# Altium footprint library 15-LEDs+LCD.PcbLib: 116 footprints (part 8 of 8)
Each footprint in its own frame and in the unit in brackets; x right, y up, seen from the top. Pads: shape width x height; smd on the part's side, far side on the other; paste and mask are expansions set on the pad; w line width, h text height; cw(c..) or ccw(c..) is an arc to the next point about the centre after c.
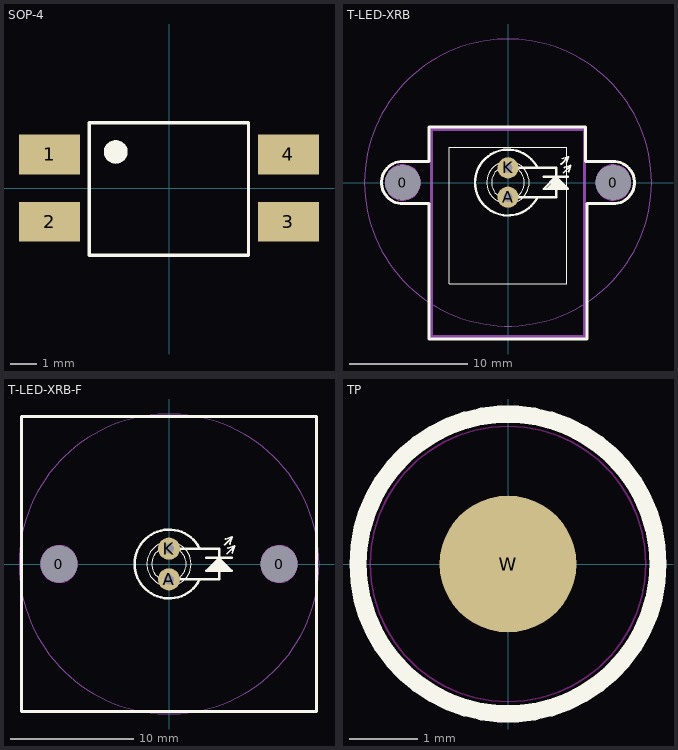
[diagram p7: the footprints below, top view; thin cyan lines are the x and y axes]

## SOP-4 [mm] "PC817"
pads (5):
  rect 2.3x1.5 smd: 1(-4.5,1.27) 2(-4.5,-1.27) 3(4.5,-1.27) 4(4.5,1.27)
  round 0.9 on Top Overlay: ""(-2.005,1.365)
Top Overlay:
  lines w0.127: -3.005,-2.535 -3.005,2.465 2.995,2.465 2.995,-2.535 -3.005,-2.535
3D body "pc817.stp": height 3.7, standoff 0, extent -4.82,-2.29 4.8,2.29

## T-LED-XRB [mm]
height 4.8
pads (4):
  round 1.5 hole 3: 0(-8.95,0) 0(8.95,0)
  round 1.8 hole 0.8: A(0,-1.25) K(0,1.25)
Top Overlay:
  circle w0.001: c0,0 r1.8
  circle w0.001: c0,0 r1.4
  lines w0.01: -5,-8.6 -5,3 5,3 5,-8.6 -5,-8.6
  lines w0.152: 4.517,1.569 5.137,2.189 ; 4.607,2.019 5.137,2.189 ; 4.717,0.839 5.337,1.459 ; 4.807,1.289 5.337,1.459 ; 4.947,1.639 5.137,2.189 ; 5.147,0.909 5.337,1.459
  lines w0.2: 2.484,-1.292 cw(c0,0) 2.484,1.292
  lines w0.203: 0,-1.25 4.09,-1.25 4.09,1.25 0,1.25 ; 3.04,0.5 5.09,0.5 ; 4.04,0.5 5.09,-0.55 3.04,-0.55 4.09,0.5
  lines w0.254: 4.09,0.2 3.39,-0.5 4.79,-0.5 4.19,0.1 3.74,-0.35 4.442,-0.35 4.242,-0.15 ; 8.9,-1.8 6.7,-1.8 6.7,-13.3 -6.731,-13.3 -6.731,-1.8 -8.9,-1.8 cw(c-8.95,0) -8.903,1.799 -6.7,1.799 -6.7,4.7 6.6,4.7 6.6,1.8 9,1.8 ; 8.9,1.799 cw(c8.95,0) 8.903,-1.799
Keep-Out Layer:
  circle w0.025: c-8.95,0 r1.5
  circle w0.025: c8.95,0 r1.5
Mechanical 1:
  circle w0.025: c8.95,0 r1.5
  circle w0.025: c-8.95,0 r1.5
Mechanical 15:
  circle w0.001: c0,0 r12.2
  lines w0.254: -6.5,-13.1 -6.5,4.5 6.5,4.5 6.5,-13.1 -6.5,-13.1
3D body "irled-cover.stp": height 18.05, standoff -3, extent -10.1,-13.05 10.1,4.45

## T-LED-XRB-F [mm]
height 4.8
pads (4):
  round 1.5 hole 3: 0(-8.95,0) 0(8.95,0)
  round 1.8 hole 0.8: A(0,-1.25) K(0,1.25)
Top Overlay:
  circle w0.001: c0,0 r1.8
  circle w0.001: c0,0 r1.4
  lines w0.152: 4.517,1.569 5.137,2.189 ; 4.607,2.019 5.137,2.189 ; 4.717,0.839 5.337,1.459 ; 4.807,1.289 5.337,1.459 ; 4.947,1.639 5.137,2.189 ; 5.147,0.909 5.337,1.459
  lines w0.2: 2.484,-1.292 cw(c0,0) 2.484,1.292
  lines w0.203: 0,-1.25 4.09,-1.25 4.09,1.25 0,1.25 ; 3.04,0.5 5.09,0.5 ; 4.04,0.5 5.09,-0.55 3.04,-0.55 4.09,0.5
  lines w0.254: 4.09,0.2 3.39,-0.5 4.79,-0.5 4.19,0.1 3.74,-0.35 4.442,-0.35 4.242,-0.15 ; -12,-12 12,-12 12,12 -12,12 -12,-12
Keep-Out Layer:
  circle w0.025: c-8.95,0 r1.5
  circle w0.025: c8.95,0 r1.5
Mechanical 1:
  circle w0.025: c8.95,0 r1.5
  circle w0.025: c-8.95,0 r1.5
Mechanical 15:
  circle w0.001: c0,0 r12.2
3D body "xrb-fledz.stp": height 22.8, standoff 0, extent -12,-12 12,12

## TP [mm]
height 11.7
pads (1):
  round 2 smd mask+1: W(0,0)
Top Overlay:
  circle w0.254: c0,0 r2.195
Keep-Out Layer:
  circle w0.025: c0,0 r2.017
3D body "1_016-1_016-3_tp.stp": height 0.02, standoff 0, extent -1.5,-1.5 1.5,1.5